# Altium integrated library ICs.IntLib: 88 symbols (part 1 of 2)
Pins are listed as number, name and electrical type; pins without a type are passive.

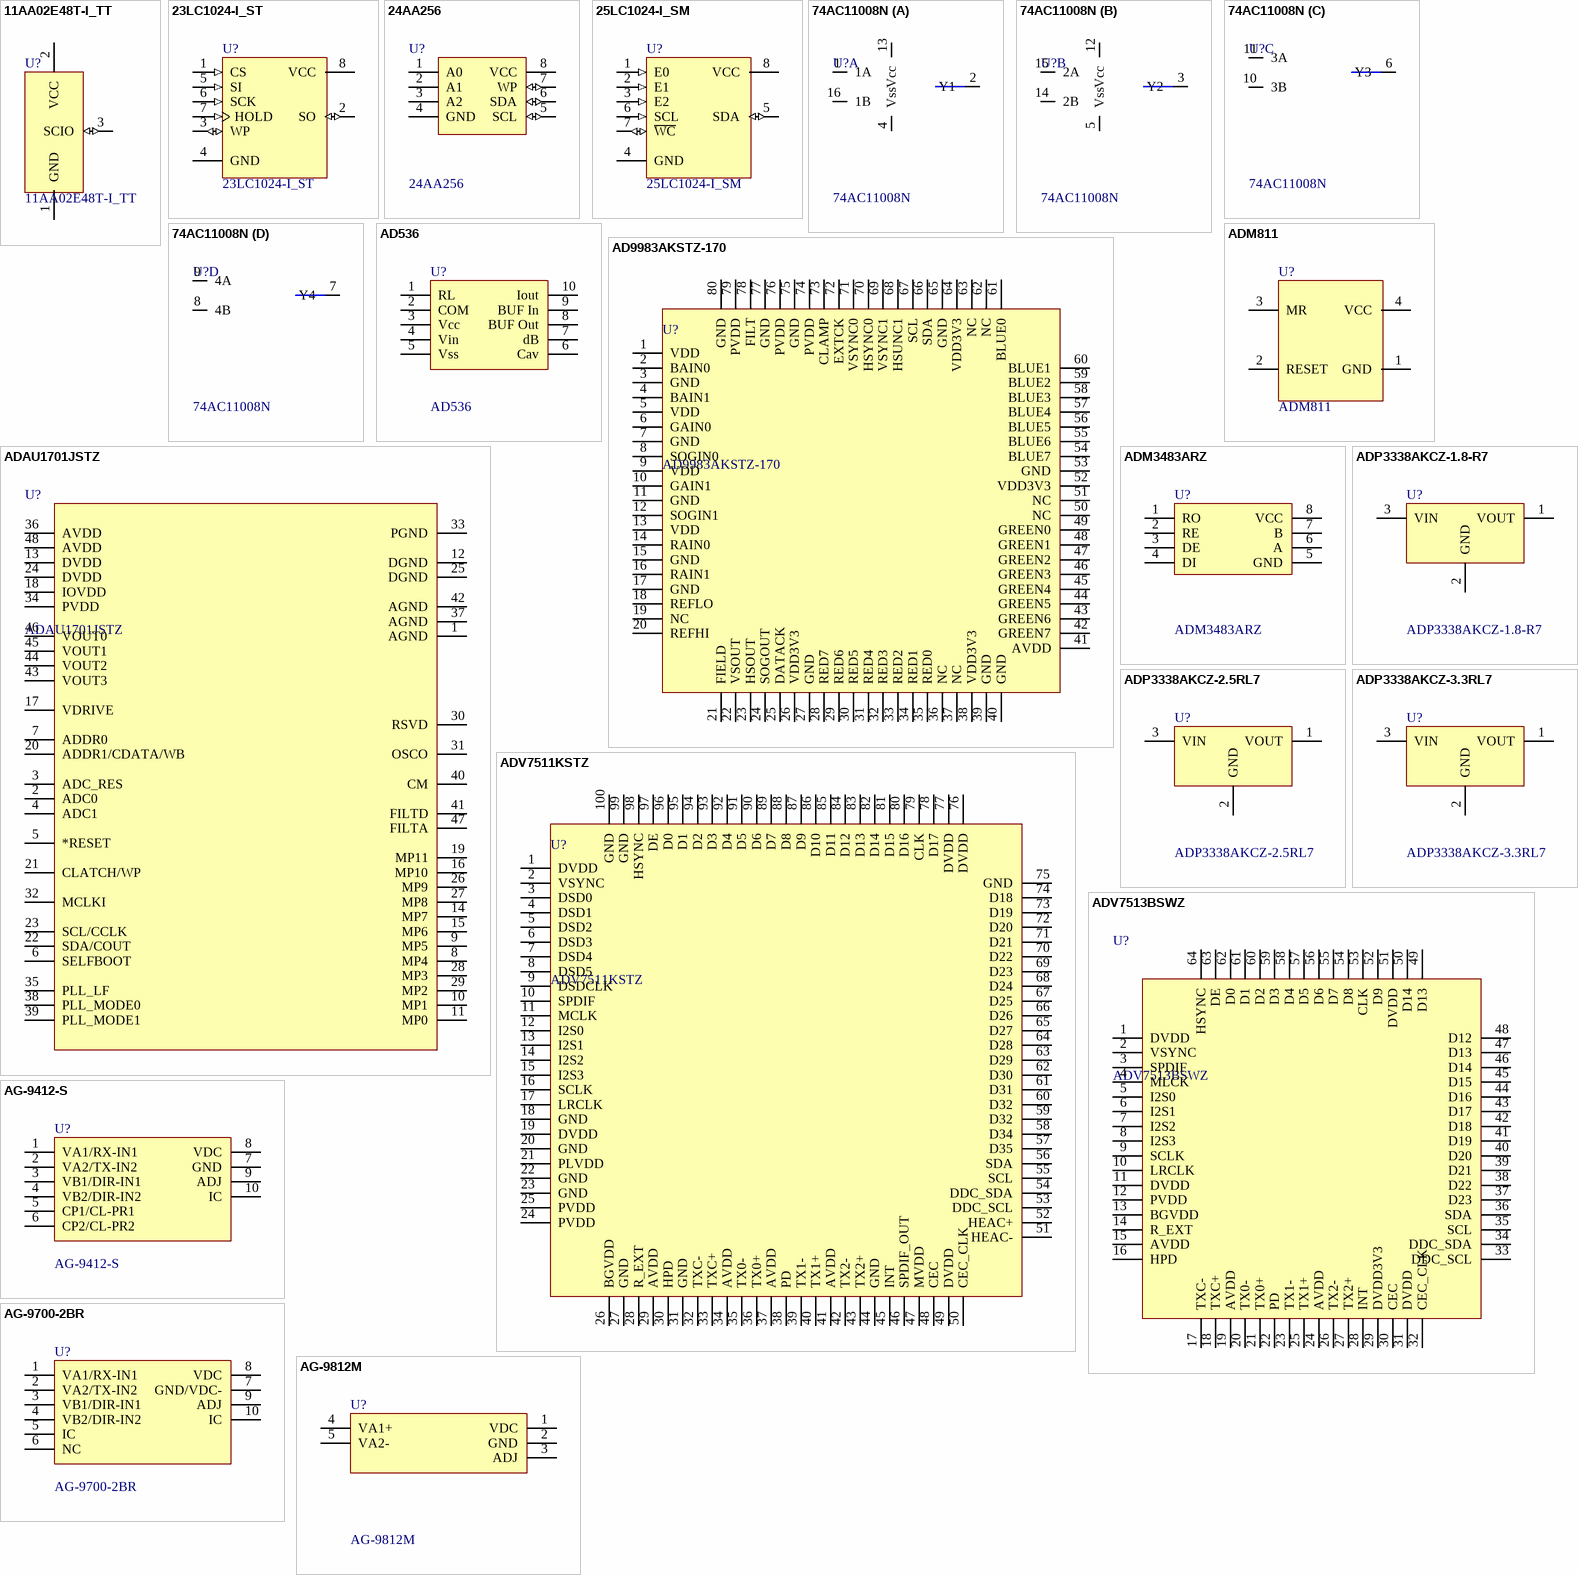
[diagram p0: symbols 11AA02E48T-I_TT to AG-9812M]

## 11AA02E48T-I_TT
designator U?
2 kbit Serial  EEPROM; Deliverer PartNr: 1707616RL; Manufacturer PartNr: 11AA02E48T-I/TT; Manufacturer: Microchip; Deliverer: Farnell; TDE-PN: IC0035; Published: 12.02.2014; PackageDescription: SOT23; Publisher: Sebastian Kulik
footprint SOT23_M (SOT23, 3-Leads, Body 2.9x1.3mm, Pitch 0.95mm, Lead Span 2.3mm - Reverse Pinning, IPC Low Density)
pins: 1 GND (power), 2 VCC (power), 3 SCIO (io)

## 23LC1024-I_ST
designator U?
1 Mbit Serial  EEPROM; Deliverer PartNr: 2212151; Manufacturer PartNr: 23LC1024-I/ST; Manufacturer: Microchip; Deliverer: Farnell; TDE-PN: IC0034; Published: 12.02.2014; PackageDescription: TSSOP8; Publisher: Sebastian Kulik
footprint TSSOP8 (Shrink Small Outline, Plastic, Thin; 8 Leads; Body Width 4.4 mm; Pitch 0.65 mm)
pins: 1 CS (in), 2 SO (io), 3 WP (io), 4 GND (power), 5 SI (in), 6 SCK (in), 7 HOLD (in), 8 VCC (power)

## 24AA256
designator U?
I2C  EEPROM; Deliverer PartNr: 1331295; Manufacturer: Microchip; Deliverer: Farnell; TDE-PN: IC0005; Published: 28.03.2014; PackageDescription: TSSOP8; Publisher: Sebastian Kulik; Manufacturer PartNr: 24AA256
footprint TSSOP8 (Shrink Small Outline, Plastic, Thin; 8 Leads; Body Width 4.4 mm; Pitch 0.65 mm)
pins: 1 A0, 2 A1, 3 A2, 4 GND (power), 5 SCL (io), 6 SDA (io), 7 WP (io), 8 VCC (power)

## 25LC1024-I_SM
designator U?
1024 Kbit Serial SPI Bus EEPROM; Deliverer PartNr: 1331393; Manufacturer: Microchip; Deliverer: Farnell; TDE-PN: IC0033; Published: 12.02.2014; PackageDescription: SOP8; Publisher: Sebastian Kulik; Manufacturer PartNr: 25LC1024-I_SM
footprint SOP8_N (SOIC, 8-Leads, Body 4.9x3.9mm, Pitch 1.27mm, IPC Medium Density)
footprint SOP8_L (SOIC, 8-Leads, Body 4.9x3.9mm, Pitch 1.27mm, IPC High Density)
footprint SOP8_M (SOIC, 8-Leads, Body 4.9x3.9mm, Pitch 1.27mm, IPC Low Density)
pins: 1 E0 (in), 2 E1 (in), 3 E2 (in), 4 GND (power), 5 SDA (io), 6 SCL (in), 7 ~{WC} (io), 8 VCC (power)

## 74AC11008N
designator U?
Quad AND, TTL; Deliverer PartNr: 1749860; Manufacturer: TI; Deliverer: Farnell; TDE-PN: IC0083; Published: 16.08.2016; PackageDescription: SOIC16; Publisher: Sebastian Kulik; Manufacturer PartNr: 74AC11008N; Price: 1.45
footprint DIP-16 (DIP; 16 Leads; Row Spacing 7.62 mm; Pitch 2.54 mm)
footprint SO-16_L (SOIC, 16-Leads, Body 9.9x3.9mm, Pitch 1.27mm, IPC High Density)
part A pins: 1 1A, 2 Y1, 4 Vss, 13 Vcc, 16 1B
part B pins: 3 Y2, 5 Vss, 12 Vcc, 14 2B, 15 2A
part C pins: 6 Y3, 10 3B, 11 3A
part D pins: 7 Y4, 8 4B, 9 4A

## AD536
designator U?
RMS converter; Deliverer PartNr: 405360; Manufacturer PartNr: AD536AJH; Manufacturer: ADI; Deliverer: Farnell; TDE-PN: IC0054; Published: 24.10.2014; PackageDescription: TO100-10; Publisher: Sebastian Kulik
footprint TO100-10 (TO100-10 Pin, 4mm radius)
pins: 1 RL, 2 COM, 3 Vcc, 4 Vin, 5 Vss, 6 Cav, 7 dB, 8 BUF Out, 9 BUF In, 10 Iout

## AD9983AKSTZ-170
designator U?
8 bit display interface; Deliverer PartNr: 759-2124; Manufacturer: ADI; Deliverer: RS-Components; TDE-PN: IC0008; Published: 27.03.2014; PackageDescription: TQFP80; Publisher: Sebastian Kulik; Manufacturer PartNr: AD9983AKSTZ-170
footprint TQFP80-1_L (Thin QFP, 80-Leads, Body 12x12mm, Pitch 0.5mm, IPC High Density)
footprint TQFP80-1_N (Thin QFP, 80-Leads, Body 12x12mm, Pitch 0.5mm, IPC Medium Density)
footprint TQFP80-1_N (Thin QFP, 80-Leads, Body 12x12mm, Pitch 0.5mm, IPC Medium Density)
pins: 1 VDD, 2 BAIN0, 3 GND, 4 BAIN1, 5 VDD, 6 GAIN0, 7 GND, 8 SOGIN0, 9 VDD, 10 GAIN1, 11 GND, 12 SOGIN1, 13 VDD, 14 RAIN0, 15 GND, 16 RAIN1, 17 GND, 18 REFLO, 19 NC, 20 REFHI, 21 FIELD, 22 VSOUT, 23 HSOUT, 24 SOGOUT, 25 DATACK, 26 VDD3V3, 27 GND, 28 RED7, 29 RED6, 30 RED5, 31 RED4, 32 RED3, 33 RED2, 34 RED1, 35 RED0, 36 NC, 37 NC, 38 VDD3V3, 39 GND, 40 GND, 41 AVDD, 42 GREEN7, 43 GREEN6, 44 GREEN5, 45 GREEN4, 46 GREEN3, 47 GREEN2, 48 GREEN1, 49 GREEN0, 50 NC, 51 NC, 52 VDD3V3, 53 GND, 54 BLUE7, 55 BLUE6, 56 BLUE5, 57 BLUE4, 58 BLUE3, 59 BLUE2, 60 BLUE1, 61 BLUE0, 62 NC, 63 NC, 64 VDD3V3, 65 GND, 66 SDA, 67 SCL, 68 HSUNC1, 69 VSYNC1, 70 HSYNC0, 71 VSYNC0, 72 EXTCK, 73 CLAMP, 74 PVDD, 75 GND, 76 PVDD, 77 GND, 78 FILT, 79 PVDD, 80 GND

## ADAU1701JSTZ
designator U?
Sigma DSP; Deliverer PartNr: 1498728; Manufacturer: ADI; Deliverer: Farnell; TDE-PN: IC0045; Published: 28.03.2014; PackageDescription: TQFP48; Publisher: Sebastian Kulik; Manufacturer PartNr: ADAU1701JSTZ
footprint TQFP48
pins: 1 AGND, 2 ADC0, 3 ADC_RES, 4 ADC1, 5 *RESET, 6 SELFBOOT, 7 ADDR0, 8 MP4, 9 MP5, 10 MP1, 11 MP0, 12 DGND, 13 DVDD, 14 MP7, 15 MP6, 16 MP10, 17 VDRIVE, 18 IOVDD, 19 MP11, 20 ADDR1/CDATA/WB, 21 CLATCH/WP, 22 SDA/COUT, 23 SCL/CCLK, 24 DVDD, 25 DGND, 26 MP9, 27 MP8, 28 MP3, 29 MP2, 30 RSVD, 31 OSCO, 32 MCLKI, 33 PGND, 34 PVDD, 35 PLL_LF, 36 AVDD, 37 AGND, 38 PLL_MODE0, 39 PLL_MODE1, 40 CM, 41 FILTD, 42 AGND, 43 VOUT3, 44 VOUT2, 45 VOUT1, 46 VOUT0, 47 FILTA, 48 AVDD

## ADM811
designator U?
ADI Supervisor Reset, 3V3; Deliverer PartNr: 2074891RL; Manufacturer PartNr: ADM811LARTZ-REEL7; Deliverer: Farnell; TDE-PN: IC0009; Published: 26.03.2014; PackageDescription: SOT143; Publisher: Sebastian Kulik; Manufacturer: ADI
footprint SOT124
pins: 1 GND, 2 RESET, 3 MR, 4 VCC (power)

## ADM3483ARZ
designator U?
Transceiver, RS485/422; Deliverer PartNr: 1274169; Manufacturer: ADI; Deliverer: Farnell; TDE-PN: IC0041; Published: 25.02.2014; PackageDescription: TSSOP8; Publisher: Sebastian Kulik; Manufacturer PartNr: ADM3483ARZ
footprint SOIC8_N (SOIC, 8-Leads, Body 4.9x3.9mm, Pitch 1.27mm, IPC Medium Density)
pins: 1 RO, 2 RE, 3 DE, 4 DI, 5 GND, 6 A, 7 B, 8 VCC (power)

## ADP3338AKCZ-1.8-R7
designator U?
LDO, 1V8_1A; Deliverer PartNr: 2112616; Manufacturer: ADI; Deliverer: Farnell; TDE-PN: IC0001; Published: 26.03.2014; PackageDescription: SOT223-1; Publisher: Sebastian Kulik; Manufacturer PartNr: ADP3338AKCZ-1.8-R7
footprint SOT223-1
pins: 1 VOUT, 2 GND, 3 VIN

## ADP3338AKCZ-2.5RL7
designator U?
LDO, 2V5_1A; Deliverer PartNr: 1651282RL; Manufacturer: ADI; Deliverer: Farnell; TDE-PN: IC0002; Published: 26.03.2014; PackageDescription: SOT223-1; Publisher: Sebastian Kulik; Manufacturer PartNr: ADP3338AKCZ-2.5RL7
footprint SOT223-1
pins: 1 VOUT, 2 GND, 3 VIN

## ADP3338AKCZ-3.3RL7
designator U?
LDO, 3V3_1A; Deliverer PartNr: 1651283; Manufacturer: ADI; Deliverer: Farnell; TDE-PN: IC0003; Published: 26.03.2014; PackageDescription: SOT223-1; Publisher: Sebastian Kulik; Manufacturer PartNr: ADP3338AKCZ-3.3RL7
footprint SOT223-1
pins: 1 VOUT, 2 GND, 3 VIN

## ADV7511KSTZ
designator U?
HDMI interface; Deliverer PartNr: 2312822; Manufacturer: ADI; Deliverer: Farnell; TDE-PN: IC0010; Published: 27.03.2014; PackageDescription: LQFP100; Publisher: Sebastian Kulik; Manufacturer PartNr: ADV7511KSTZ
footprint LQFP100
pins: 1 DVDD, 2 VSYNC, 3 DSD0, 4 DSD1, 5 DSD2, 6 DSD3, 7 DSD4, 8 DSD5, 9 DSDCLK, 10 SPDIF, 11 MCLK, 12 I2S0, 13 I2S1, 14 I2S2, 15 I2S3, 16 SCLK, 17 LRCLK, 18 GND, 19 DVDD, 20 GND, 21 PLVDD, 22 GND, 23 GND, 24 PVDD, 25 PVDD, 26 BGVDD, 27 GND, 28 R_EXT, 29 AVDD, 30 HPD, 31 GND, 32 TXC-, 33 TXC+, 34 AVDD, 35 TX0-, 36 TX0+, 37 AVDD, 38 PD, 39 TX1-, 40 TX1+, 41 AVDD, 42 TX2-, 43 TX2+, 44 GND, 45 INT, 46 SPDIF_OUT, 47 MVDD, 48 CEC, 49 DVDD, 50 CEC_CLK, 51 HEAC-, 52 HEAC+, 53 DDC_SCL, 54 DDC_SDA, 55 SCL, 56 SDA, 57 D35, 58 D34, 59 D32, 60 D32, 61 D31, 62 D30, 63 D29, 64 D28, 65 D27, 66 D26, 67 D25, 68 D24, 69 D23, 70 D22, 71 D21, 72 D20, 73 D19, 74 D18, 75 GND, 76 DVDD, 77 DVDD, 78 D17, 79 CLK, 80 D16, 81 D15, 82 D14, 83 D13, 84 D12, 85 D11, 86 D10, 87 D9, 88 D8, 89 D7, 90 D6, 91 D5, 92 D4, 93 D3, 94 D2, 95 D1, 96 D0, 97 DE, 98 HSYNC, 99 GND, 100 GND

## ADV7513BSWZ
designator U?
HDMI transmitter; Deliverer PartNr: ADV7513BSWZ-ND; Manufacturer: ADI; Deliverer: Digi Key; TDE-PN: IC0011; Published: 27.03.2014; PackageDescription: TQFP64; Publisher: Sebastian Kulik; Manufacturer PartNr: ADV7513BSWZ
footprint TQFP-64_N1 (64-Pin Thin Plastic Quad Flat Pack 0.5 mm Pitch, 1.0/0.1 mm Lead Form, IPC Medium Density)
pins: 1 DVDD, 2 VSYNC, 3 SPDIF, 4 MLCK, 5 I2S0, 6 I2S1, 7 I2S2, 8 I2S3, 9 SCLK, 10 LRCLK, 11 DVDD, 12 PVDD, 13 BGVDD, 14 R_EXT, 15 AVDD, 16 HPD, 17 TXC-, 18 TXC+, 19 AVDD, 20 TX0-, 21 TX0+, 22 PD, 23 TX1-, 24 AVDD, 25 TX1+, 26 TX2-, 27 TX2+, 28 INT, 29 DVDD3V3, 30 CEC, 31 DVDD, 32 CEC_CLK, 33 DDC_SCL, 34 DDC_SDA, 35 SCL, 36 SDA, 37 D23, 38 D22, 39 D21, 40 D20, 41 D19, 42 D18, 43 D17, 44 D16, 45 D15, 46 D14, 47 D13, 48 D12, 49 D13, 50 D14, 51 DVDD, 52 D9, 53 CLK, 54 D8, 55 D7, 56 D6, 57 D5, 58 D4, 59 D3, 60 D2, 61 D1, 62 D0, 63 DE, 64 HSYNC

## AG-9412-S
designator U?
PoE, 12V; Manufacturer: Silvertel; TDE-PN: IC0038; Published: 17.02.2014; Deliverer PartNr: -; Deliverer: -; PackageDescription: AG-9412-S; Publisher: Sebastian Kulik; Manufacturer PartNr: AG-9412-S
footprint AG-9412-S
footprint AG-9412-S-1
pins: 1 VA1/RX-IN1, 2 VA2/TX-IN2, 3 VB1/DIR-IN1, 4 VB2/DIR-IN2, 5 CP1/CL-PR1, 6 CP2/CL-PR2, 7 GND, 8 VDC (power), 9 ADJ, 10 IC

## AG-9700-2BR
designator U?
PoE, 12V, 12W; Manufacturer: Silvertel; TDE-PN: IC0047; Published: 23.05.2014; Deliverer PartNr: -; Deliverer: -; PackageDescription: AG9700-2BR; Publisher: Sebastian Kulik; Manufacturer PartNr: AG-9700-2BR
footprint Ag9700-2BR (Silvertel, Ag9700-Small)
pins: 1 VA1/RX-IN1, 2 VA2/TX-IN2, 3 VB1/DIR-IN1, 4 VB2/DIR-IN2, 5 IC, 6 NC, 7 GND/VDC-, 8 VDC (power), 9 ADJ, 10 IC

## AG-9812M
designator U?
PoE, 12V; Manufacturer: Silvertel; Deliverer: Codico; TDE-PN: IC0052; Published: 17.02.2014; Deliverer PartNr: AG-9812M; PackageDescription: AG9812M; Publisher: Sebastian Kulik; Manufacturer PartNr: AG-9812M
footprint Ag9812M (Silvertel, Ag9812M)
pins: 1 VDC (power), 2 GND, 3 ADJ, 4 VA1+, 5 VA2-

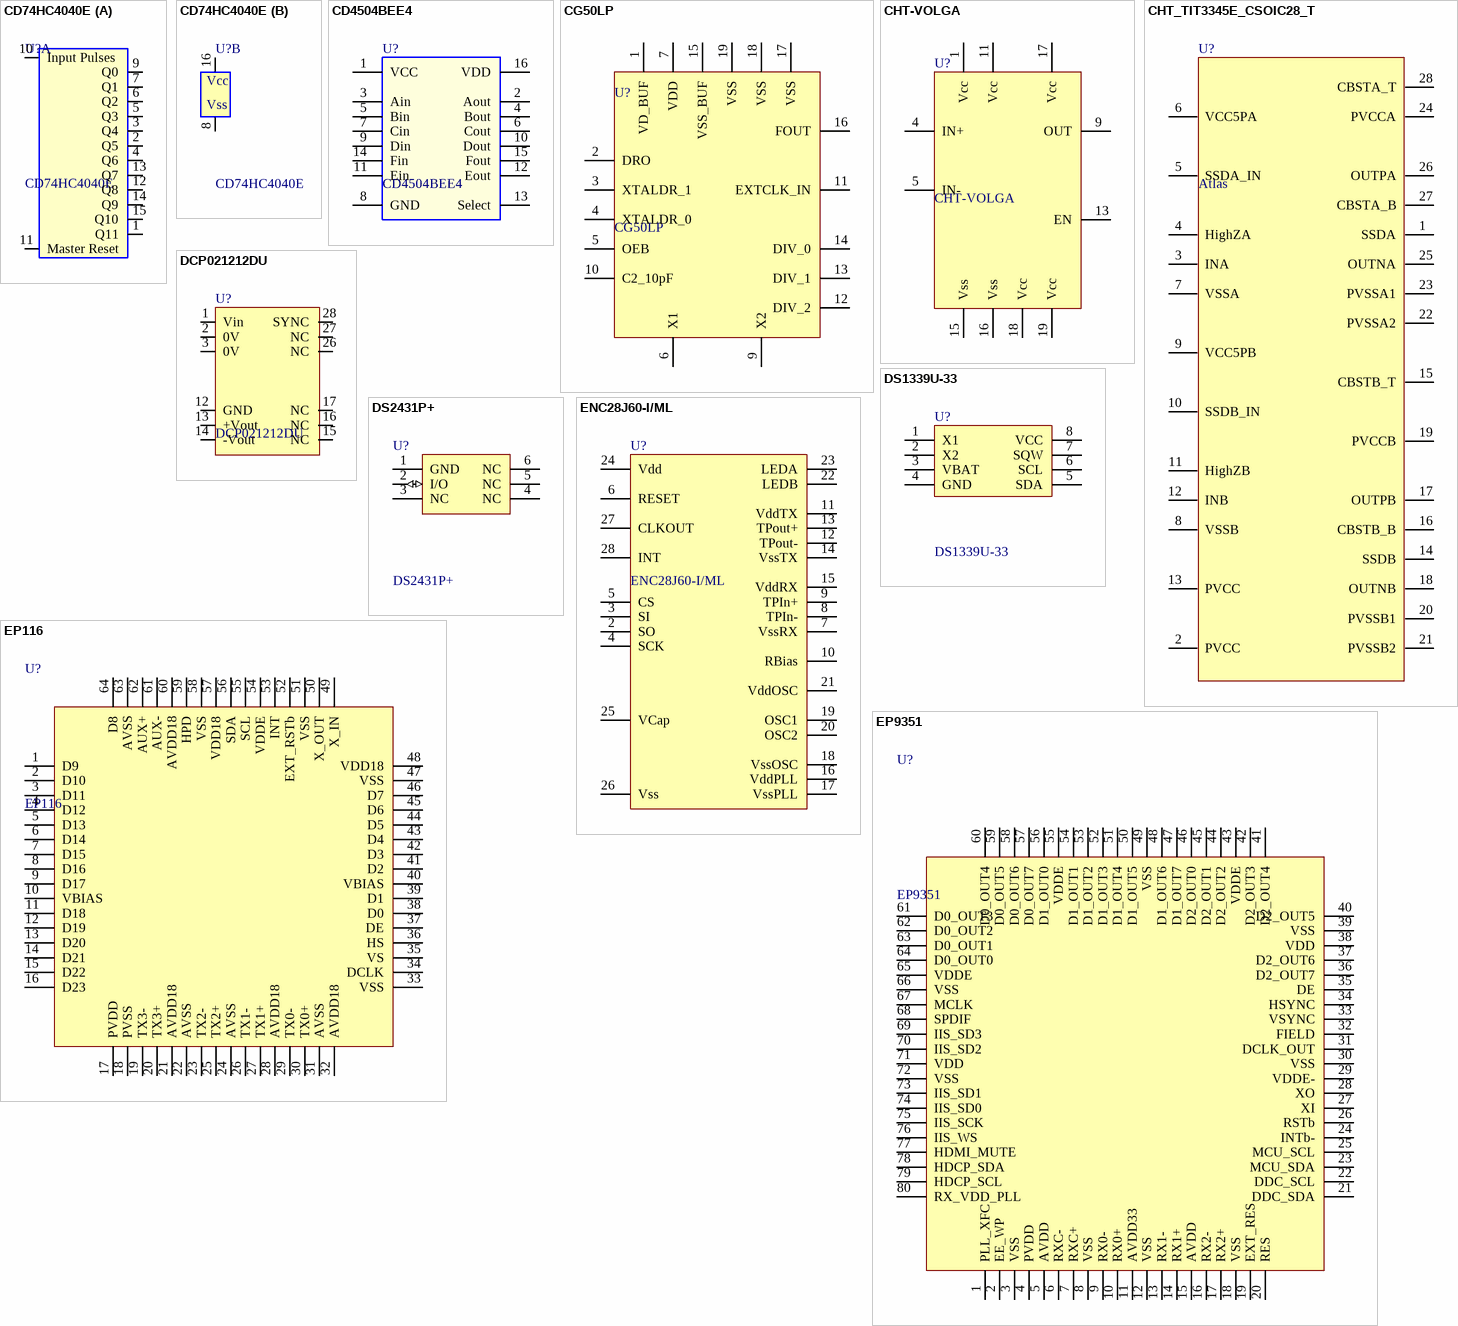
[diagram p1: symbols CD74HC4040E to EP9351]

## CD74HC4040E
designator U?
High Speed CMOS Logic 12-Stage Binary Counter; Deliverer PartNr: 807-2457; Manufacturer: TI; Deliverer: RS; TDE-PN: IC0090; Published: 09.12.2016; PackageDescription: DIP16; Publisher: Sebastian Kulik; Manufacturer PartNr: CD74HC4040E; Price: 0.464/25
footprint DIP-16 (DIP; 16 Leads; Row Spacing 7.62 mm; Pitch 2.54 mm)
part A pins: 1 Q11, 2 Q5, 3 Q4, 4 Q6, 5 Q3, 6 Q2, 7 Q1, 9 Q0, 10 Input Pulses, 11 Master Reset, 12 Q8, 13 Q7, 14 Q9, 15 Q10
part B pins: 8 Vss, 16 Vcc

## CD4504BEE4
designator U?
20V Level shifter; Deliverer PartNr: 709-2545; Manufacturer: TI; Deliverer: RS; TDE-PN: IC00084; Published: 16.08.2016; PackageDescription: DIP16; Publisher: Sebastian Kulik; Manufacturer PartNr: CD4504BEE4; Price: 0.204/10
footprint DIP-16 (DIP; 16 Leads; Row Spacing 7.62 mm; Pitch 2.54 mm)
pins: 1 VCC, 2 Aout, 3 Ain, 4 Bout, 5 Bin, 6 Cout, 7 Cin, 8 GND, 9 Din, 10 Dout, 11 Ein, 12 Eout, 13 Select, 14 Fin, 15 Fout, 16 VDD

## CG50LP
designator U?
VERSATILE CRYSTAL CLOCK GENERATOR - 2ND GEN; Deliverer: CISSOID; TDE-PN: IC0085; Published: 22.11.2016; Deliverer PartNr: CG50LP; PackageDescription: TDFP16; Publisher: Sebastian Kulik; Manufacturer PartNr: CG50LP; Manufacturer: CISSOID; Price: --
footprint TDFP16
pins: 1 VD_BUF, 2 DRO, 3 XTALDR_1, 4 XTALDR_0 (power), 5 OEB, 6 X1 (power), 7 VDD (power), 9 X2 (power), 10 C2_10pF (power), 11 EXTCLK_IN, 12 DIV_2 (power), 13 DIV_1 (power), 14 DIV_0 (power), 15 VSS_BUF, 16 FOUT (power), 17 VSS (power), 18 VSS (power), 19 VSS (power)

## CHT-VOLGA
designator U?
Comparator, Hi-Temp, 25MHz; Deliverer: CISSOID; TDE-PN: IC0080; Published: 01.08.2016; Deliverer PartNr: CHT-VOLGA; PackageDescription: DIP16; Publisher: Sebastian Kulik; Manufacturer PartNr: CHT-VOLGA; Manufacturer: CISSOID; Price: 204.93/5
footprint TDFP16
pins: 1 Vcc, 4 IN+, 5 IN-, 9 OUT (power), 11 Vcc (power), 13 EN, 15 Vss (power), 16 Vss, 17 Vcc, 18 Vcc (power), 19 Vcc (power)

## CHT_TIT3345E_CSOIC28_T
designator U?, comment Atlas
Gate driver, 30V, HT; Deliverer PartNr: CHT-TIT3345E-CSOIC28-T; Manufacturer: CISSOID; Deliverer: Future; TDE-PN: IC0075; Published: 12.05.2016; PackageDescription: SOIC28; Publisher: Sebastian Kulik; Manufacturer PartNr: CHT-TIT3345E-CSOIC28-T; Price: 481.89
footprint SOIC28 (SOIC, 28-Leads, Body 8x18mm, Pitch 1.27mm, IPC High Density)
pins: 1 SSDA (power), 2 PVCC, 3 INA, 4 HighZA, 5 SSDA_IN, 6 VCC5PA, 7 VSSA, 8 VSSB, 9 VCC5PB, 10 SSDB_IN, 11 HighZB, 12 INB, 13 PVCC, 14 SSDB (power), 15 CBSTB_T, 16 CBSTB_B, 17 OUTPB (power), 18 OUTNB, 19 PVCCB, 20 PVSSB1 (power), 21 PVSSB2, 22 PVSSA2, 23 PVSSA1 (power), 24 PVCCA, 25 OUTNA, 26 OUTPA (power), 27 CBSTA_B, 28 CBSTA_T (power)

## DCP021212DU
designator U?
Isolated DC-DC converter; Manufacturer: TI; Deliverer: EBV; TDE-PN: IC0046; Published: 20.05.2014; Deliverer PartNr: DCP021212DU; PackageDescription: SO28; Publisher: Sebastian Kulik; Manufacturer PartNr: DCP021212DU
footprint SO28
pins: 1 Vin, 2 0V, 3 0V, 12 GND, 13 +Vout, 14 -Vout, 15 NC, 16 NC, 17 NC, 26 NC, 27 NC, 28 SYNC

## DS1339U-33
designator U?
RTC; Deliverer PartNr: 1379717; Manufacturer: Dallas; Deliverer: Farnell; TDE-PN: IC0042; Published: 25.02.2014; PackageDescription: uSOP8; Publisher: Sebastian Kulik; Manufacturer PartNr: DS1339U-33
footprint uSOP8 (Shrink Small Outline, Plastic, Thin; 8 Leads; Body Width 4.4 mm; Pitch 0.65 mm)
pins: 1 X1, 2 X2, 3 VBAT, 4 GND, 5 SDA, 6 SCL, 7 SQW, 8 VCC (power)

## DS2431P+
designator U?
1-Wire EEPROM; Deliverer PartNr: 1606351; Manufacturer: Maxim; Deliverer: Farnell; TDE-PN: IC0065; Published: 29.04.2015; PackageDescription: TSOP6; Publisher: Sebastian Kulik; Manufacturer PartNr: DS2431P+
footprint TSOP6
pins: 1 GND, 2 I/O (io), 3 NC, 4 NC, 5 NC, 6 NC

## ENC28J60-I/ML
designator U?
Ethernet controller W/SPI; Deliverer PartNr: 1564400; Manufacturer: Microchip; Deliverer: Farnell; TDE-PN: IC0058; Published: 10.11.2014; PackageDescription: QFN28; Publisher: Sebastian Kulik; Manufacturer PartNr: ENC28J60-I/ML
footprint QFN28_LONG_ERRLES
pins: 2 SO, 3 SI, 4 SCK, 5 CS, 6 RESET, 7 VssRX, 8 TPIn-, 9 TPIn+, 10 RBias, 11 VddTX, 12 TPout-, 13 TPout+, 14 VssTX, 15 VddRX, 16 VddPLL, 17 VssPLL, 18 VssOSC, 19 OSC1, 20 OSC2, 21 VddOSC, 22 LEDB, 23 LEDA, 24 Vdd, 25 VCap, 26 Vss, 27 CLKOUT, 28 INT

## EP116
designator U?
DP/eDP transmitter; Manufacturer: Explore; Deliverer: INELTEK; TDE-PN: IC0013; Published: 01.04.2014; Deliverer PartNr: EP116; PackageDescription: LQFP64; Publisher: Sebastian Kulik; Manufacturer PartNr: EP116
footprint LQFP-64 (64-Pin Thin Plastic Quad Flat Pack 0.5 mm Pitch, 0.4mm Lead Form, IPC High Density)
pins: 1 D9, 2 D10, 3 D11, 4 D12, 5 D13, 6 D14, 7 D15, 8 D16, 9 D17, 10 VBIAS, 11 D18, 12 D19, 13 D20, 14 D21, 15 D22, 16 D23, 17 PVDD, 18 PVSS, 19 TX3-, 20 TX3+, 21 AVDD18, 22 AVSS, 23 TX2-, 24 AVSS, 25 TX2+, 26 TX1-, 27 TX1+, 28 AVDD18, 29 TX0-, 30 TX0+, 31 AVSS, 32 AVDD18, 33 VSS, 34 DCLK, 35 VS, 36 HS, 37 DE, 38 D0, 39 D1, 40 VBIAS, 41 D2, 42 D3, 43 D4, 44 D5, 45 D6, 46 D7, 47 VSS, 48 VDD18, 49 X_IN, 50 X_OUT, 51 VSS, 52 EXT_RSTb, 53 INT, 54 VDDE, 55 SCL, 56 SDA, 57 VDD18, 58 VSS, 59 HPD, 60 AVDD18, 61 AUX-, 62 AUX+, 63 AVSS, 64 D8

## EP9351
designator U?
HDMI 1.3 receiver; Manufacturer: Explore; Deliverer: INELTEK; TDE-PN: IC0014; Published: 1.04.2014; Deliverer PartNr: EP9351; PackageDescription: LQFP100; Publisher: Sebastian Kulik; Manufacturer PartNr: EP9351
footprint LQFP80
pins: 1 PLL_XFC, 2 EE_WP, 3 VSS, 4 PVDD, 5 AVDD, 6 RXC-, 7 RXC+, 8 VSS, 9 RX0-, 10 RX0+, 11 AVDD33, 12 VSS, 13 RX1-, 14 RX1+, 15 AVDD, 16 RX2-, 17 RX2+, 18 VSS, 19 EXT_RES, 20 RES, 21 DDC_SDA, 22 DDC_SCL, 23 MCU_SDA, 24 INTb-, 25 MCU_SCL, 26 RSTb, 27 XI, 28 XO, 29 VDDE-, 30 VSS, 31 DCLK_OUT, 32 FIELD, 33 VSYNC, 34 HSYNC, 35 DE, 36 D2_OUT7, 37 D2_OUT6, 38 VDD, 39 VSS, 40 D2_OUT5, 41 D2_OUT4, 42 D2_OUT3, 43 VDDE, 44 D2_OUT2, 45 D2_OUT1, 46 D2_OUT0, 47 D1_OUT7, 48 D1_OUT6, 49 VSS, 50 D1_OUT5, 51 D1_OUT4, 52 D1_OUT3, 53 D1_OUT2, 54 D1_OUT1, 55 VDDE, 56 D1_OUT0, 57 D0_OUT7, 58 D0_OUT6, 59 D0_OUT5, 60 D0_OUT4, 61 D0_OUT3, 62 D0_OUT2, 63 D0_OUT1, 64 D0_OUT0, 65 VDDE, 66 VSS, 67 MCLK, 68 SPDIF, 69 IIS_SD3, 70 IIS_SD2, 71 VDD, 72 VSS, 73 IIS_SD1, 74 IIS_SD0, 75 IIS_SCK, 76 IIS_WS, 77 HDMI_MUTE, 78 HDCP_SDA, 79 HDCP_SCL, 80 RX_VDD_PLL

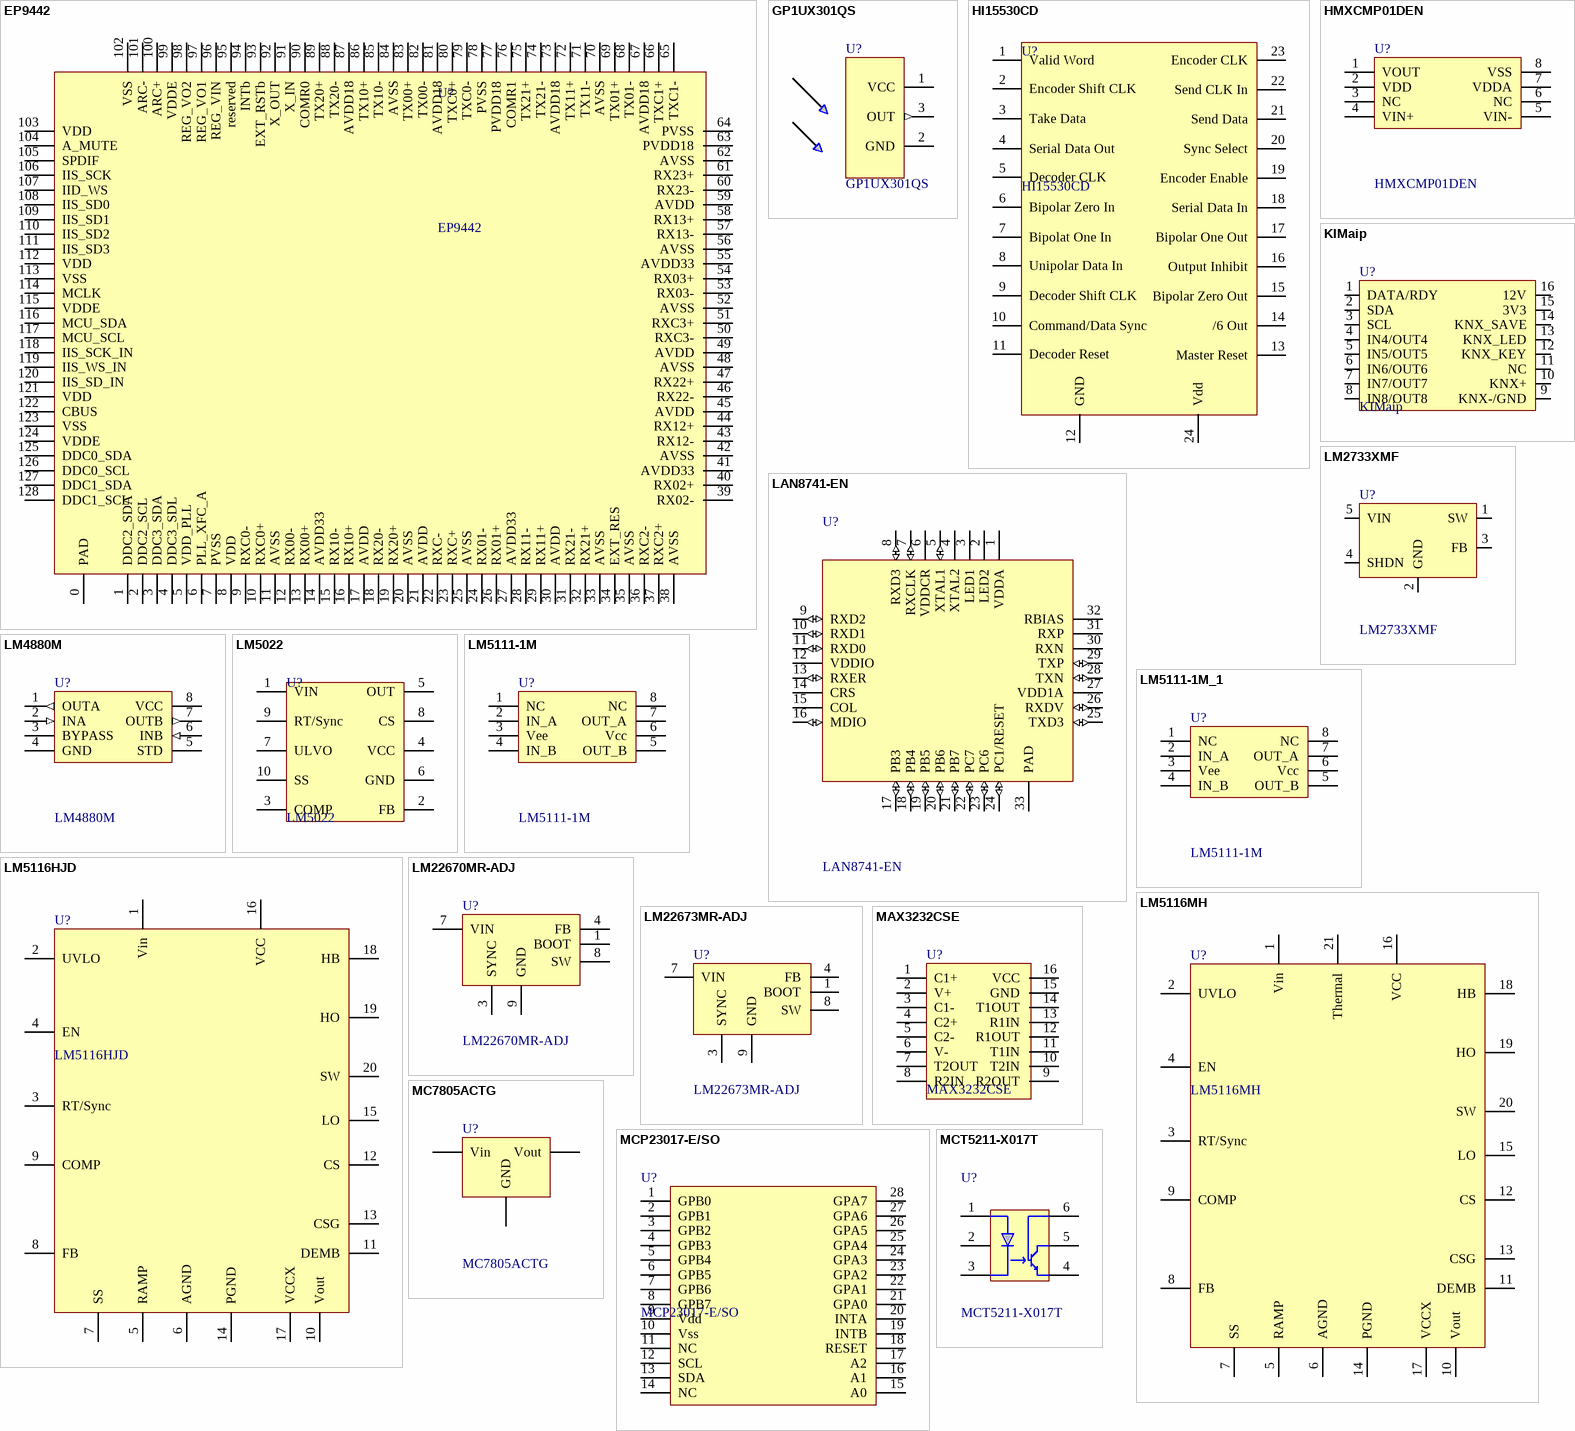
[diagram p2: symbols EP9442 to MCT5211-X017T]

## EP9442
designator U?
HDMI equalizer; Manufacturer: Explore; Deliverer: INELTEK; TDE-PN: IC0015; Published: 27.03.2014; Deliverer PartNr: EP9442; PackageDescription: Quad128; Publisher: Sebastian Kulik; Manufacturer PartNr: EP9442
footprint Quad128
pins: 0 PAD, 1 DDC2_SDA, 2 DDC2_SCL, 3 DDC3_SDA, 4 DDC3_SDL, 5 VDD_PLL, 6 PLL_XFC_A, 7 PVSS, 8 VDD, 9 RXC0-, 10 RXC0+, 11 AVSS, 12 RX00-, 13 RX00+, 14 AVDD33, 15 RX10-, 16 RX10+, 17 AVDD, 18 RX20-, 19 RX20+, 20 AVSS, 21 AVDD, 22 RXC-, 23 RXC+, 24 RX01-, 25 AVSS, 26 RX01+, 27 AVDD33, 28 RX11-, 29 RX11+, 30 AVDD, 31 RX21-, 32 RX21+, 33 AVSS, 34 EXT_RES, 35 AVSS, 36 RXC2-, 37 RXC2+, 38 AVSS, 39 RX02-, 40 RX02+, 41 AVDD33, 42 AVSS, 43 RX12-, 44 RX12+, 45 AVDD, 46 RX22-, 47 RX22+, 48 AVSS, 49 AVDD, 50 RXC3-, 51 RXC3+, 52 AVSS, 53 RX03-, 54 RX03+, 55 AVDD33, 56 AVSS, 57 RX13-, 58 RX13+, 59 AVDD, 60 RX23-, 61 RX23+, 62 AVSS, 63 PVDD18, 64 PVSS, 65 TXC1-, 66 TXC1+, 67 AVDD18, 68 TX01-, 69 TX01+, 70 AVSS, 71 TX11-, 72 TX11+, 73 AVDD18, 74 TX21-, 75 TX21+, 76 COMR1, 77 PVDD18, 78 PVSS, 79 TXC0-, 80 TXC0+, 81 AVDD18, 82 TX00-, 83 TX00+, 84 AVSS, 85 TX10-, 86 TX10+, 87 AVDD18, 88 TX20-, 89 TX20+, 90 COMR0, 91 X_IN, 92 X_OUT, 93 EXT_RSTb, 94 INTb, 95 reserved, 96 REG_VIN, 97 REG_VO1, 98 REG_VO2, 99 VDDE, 100 ARC+, 101 ARC-, 102 VSS, 103 VDD, 104 A_MUTE, 105 SPDIF, 106 IIS_SCK, 107 IID_WS, 108 IIS_SD0, 109 IIS_SD1, 110 IIS_SD2, 111 IIS_SD3, 112 VDD, 113 VSS, 114 MCLK, 115 VDDE, 116 MCU_SDA, 117 MCU_SCL, 118 IIS_SCK_IN, 119 IIS_WS_IN, 120 IIS_SD_IN, 121 VDD, 122 CBUS, 123 VSS, 124 VDDE, 125 DDC0_SDA, 126 DDC0_SCL, 127 DDC1_SDA, 128 DDC1_SCL

## Eye
designator *  (value not drawn)
footprint Eye

## GP1UX301QS
designator U?
IR reseiver; Deliverer PartNr: 666-6542P; Manufacturer: Sharp; Deliverer: RS Components; TDE-PN: IC0039; Published: 17.02.2014; PackageDescription: IR-GP; Publisher: Sebastian Kulik; Manufacturer PartNr: GP1UX301QS
footprint IR-GP
pins: 1 VCC (power), 2 GND (power), 3 OUT (out)

## HI15530CD
designator U?
Manchester Encoder / Decoder; Deliverer PartNr: HI-15530CD; Manufacturer: HolTEc; Deliverer: ProTec; TDE-PN: IC0078; Published: 18.07.2016; PackageDescription: DIP24; Publisher: Sebastian Kulik; Manufacturer PartNr: HI-15530CD; Price: 131.25/1
footprint DIP-24-Ceramic-HT (DIP; 24 Leads; Row Spacing 7.62 mm; Pitch 2.54 mm)
pins: 1 Valid Word, 2 Encoder Shift CLK, 3 Take Data, 4 Serial Data Out, 5 Decoder CLK, 6 Bipolar Zero In, 7 Bipolat One In, 8 Unipolar Data In (power), 9 Decoder Shift CLK (power), 10 Command/Data Sync (power), 11 Decoder Reset (power), 12 GND (power), 13 Master Reset, 14 /6 Out, 15 Bipolar Zero Out (power), 16 Output Inhibit, 17 Bipolar One Out, 18 Serial Data In, 19 Encoder Enable, 20 Sync Select, 21 Send Data, 22 Send CLK In, 23 Encoder CLK, 24 Vdd

## HMXCMP01DEN
designator U?
HiTemp Comparator; Manufacturer: X-Rel; Deliverer: ProTec; TDE-PN: IC0069; Published: 10.12.2015; Deliverer PartNr: HMXCMP01DEN; PackageDescription: Honeywell-SO8; Publisher: Sebastian Kulik; Manufacturer PartNr: HMXCMP01DEN
footprint Honeywell-SO8
pins: 1 VOUT, 2 VDD, 3 NC, 4 VIN+, 5 VIN-, 6 NC, 7 VDDA, 8 VSS

## KIMaip
designator U?
PoE, 12V; Manufacturer: Tapko; TDE-PN: IC0040; Published: 25.02.2014; Deliverer PartNr: -; Deliverer: -; PackageDescription: KIMaip; Publisher: Sebastian Kulik; Manufacturer PartNr: KIMaip
footprint KIMaip
pins: 1 DATA/RDY, 2 SDA, 3 SCL, 4 IN4/OUT4, 5 IN5/OUT5, 6 IN6/OUT6, 7 IN7/OUT7, 8 IN8/OUT8 (power), 9 KNX-/GND, 10 KNX+, 11 NC, 12 KNX_KEY, 13 KNX_LED, 14 KNX_SAVE, 15 3V3, 16 12V

## LAN8741-EN
designator U?
Ethernet Phy; Deliverer PartNr: 2373284; Manufacturer: Microchip; TDE-PN: IC0036; Deliverer: Farnell; Published: 12.02.2014; LatestRevisionNote: IPC-7351 Footprint Added.; Publisher: Sebastian Kulik; Manufacturer PartNr: LAN8741-EN; PackageDescription: 32M1-A-L/M/N
footprint 32M1-A_M (QFN, 32-Leads, Body 5x5mm, Pitch 0.5mm, IPC Low Density)
footprint 32M1-A_L (QFN, 32-Leads, Body 5x5mm, Pitch 0.5mm, IPC High Density)
footprint 32M1-A_N (QFN, 32-Leads, Body 5x5mm, Pitch 0.5mm, IPC Medium Density)
pins: 1 VDDA, 2 LED2, 3 LED1 (power), 4 XTAL2 (power), 5 XTAL1 (io), 6 VDDCR, 7 RXCLK (io), 8 RXD3 (io), 9 RXD2 (io), 10 RXD1 (io), 11 RXD0 (io), 12 VDDIO, 13 RXER (io), 14 CRS, 15 COL, 16 MDIO (io), 17 PB3 (io), 18 PB4 (io), 19 PB5 (io), 20 PB6 (io), 21 PB7 (io), 22 PC7 (io), 23 PC6 (io), 24 PC1/RESET (io), 25 TXD3 (io), 26 RXDV (io), 27 VDD1A, 28 TXN (io), 29 TXP (io), 30 RXN, 31 RXP, 32 RBIAS (power), 33 PAD (power)

## LM2733XMF
designator U?
TI, buck boost converter, 1A max; Deliverer PartNr: LM2733XMF/NOPB; Deliverer: EBV; TDE-PN: IC0051; Published: 30.06.2014; PackageDescription: PDSO-G5; Publisher: Sebastian Kulik; Manufacturer PartNr: LM2733XMF/NOPB; Manufacturer: TI
footprint PDSO-G5
pins: 1 SW (power), 2 GND, 3 FB, 4 SHDN, 5 VIN

## LM4880M
designator U?
Headphone AMP; Deliverer PartNr: 9493921; Manufacturer: TI; Deliverer: Farnell; TDE-PN: IC0018; Published: 28.03.2014; PackageDescription: SOP8_L; Publisher: Sebastian Kulik; Manufacturer PartNr: LM4880M
footprint SOP8_L (SOIC, 8-Leads, Body 4.9x3.9mm, Pitch 1.27mm, IPC High Density)
pins: 1 OUTA (out), 2 INA (in), 3 BYPASS, 4 GND, 5 STD, 6 INB (in), 7 OUTB (out), 8 VCC (power)

## LM5022
designator U?
TI, buck-boost, SEPIC; Deliverer PartNr: 1564781; Deliverer: Farnell; TDE-PN: IC0070; Published: 28.03.2014; PackageDescription: VSOP10; Publisher: Sebastian Kulik; Manufacturer PartNr: LM5022; Manufacturer: TI
footprint VSOP10
pins: 1 VIN, 2 FB (power), 3 COMP, 4 VCC, 5 OUT, 6 GND, 7 ULVO, 8 CS, 9 RT/Sync, 10 SS
